# Altium integrated library Mastermind Devices.IntLib: 910 symbols (part 3 of 6) (continued)
## MOSFET-NCE6005AS
designator U?, comment NCE6005AS  (value not drawn)
2 N-Channel 60V 7A 27mΩ@4.5V,4A 2W 2.4V@250uA  SOIC-8 MOSFETs ROHS
footprint SOIC-8E (SOIC, 8-Leads, Body 4.90x3.90mm, Pitch 1.27mm, IPC Medium Density); pin to pad 6>5+6 8>7+8
part A pins: 1 S1, 2 G1, 8 D1
part B pins: 3 S2, 4 G2, 6 D2

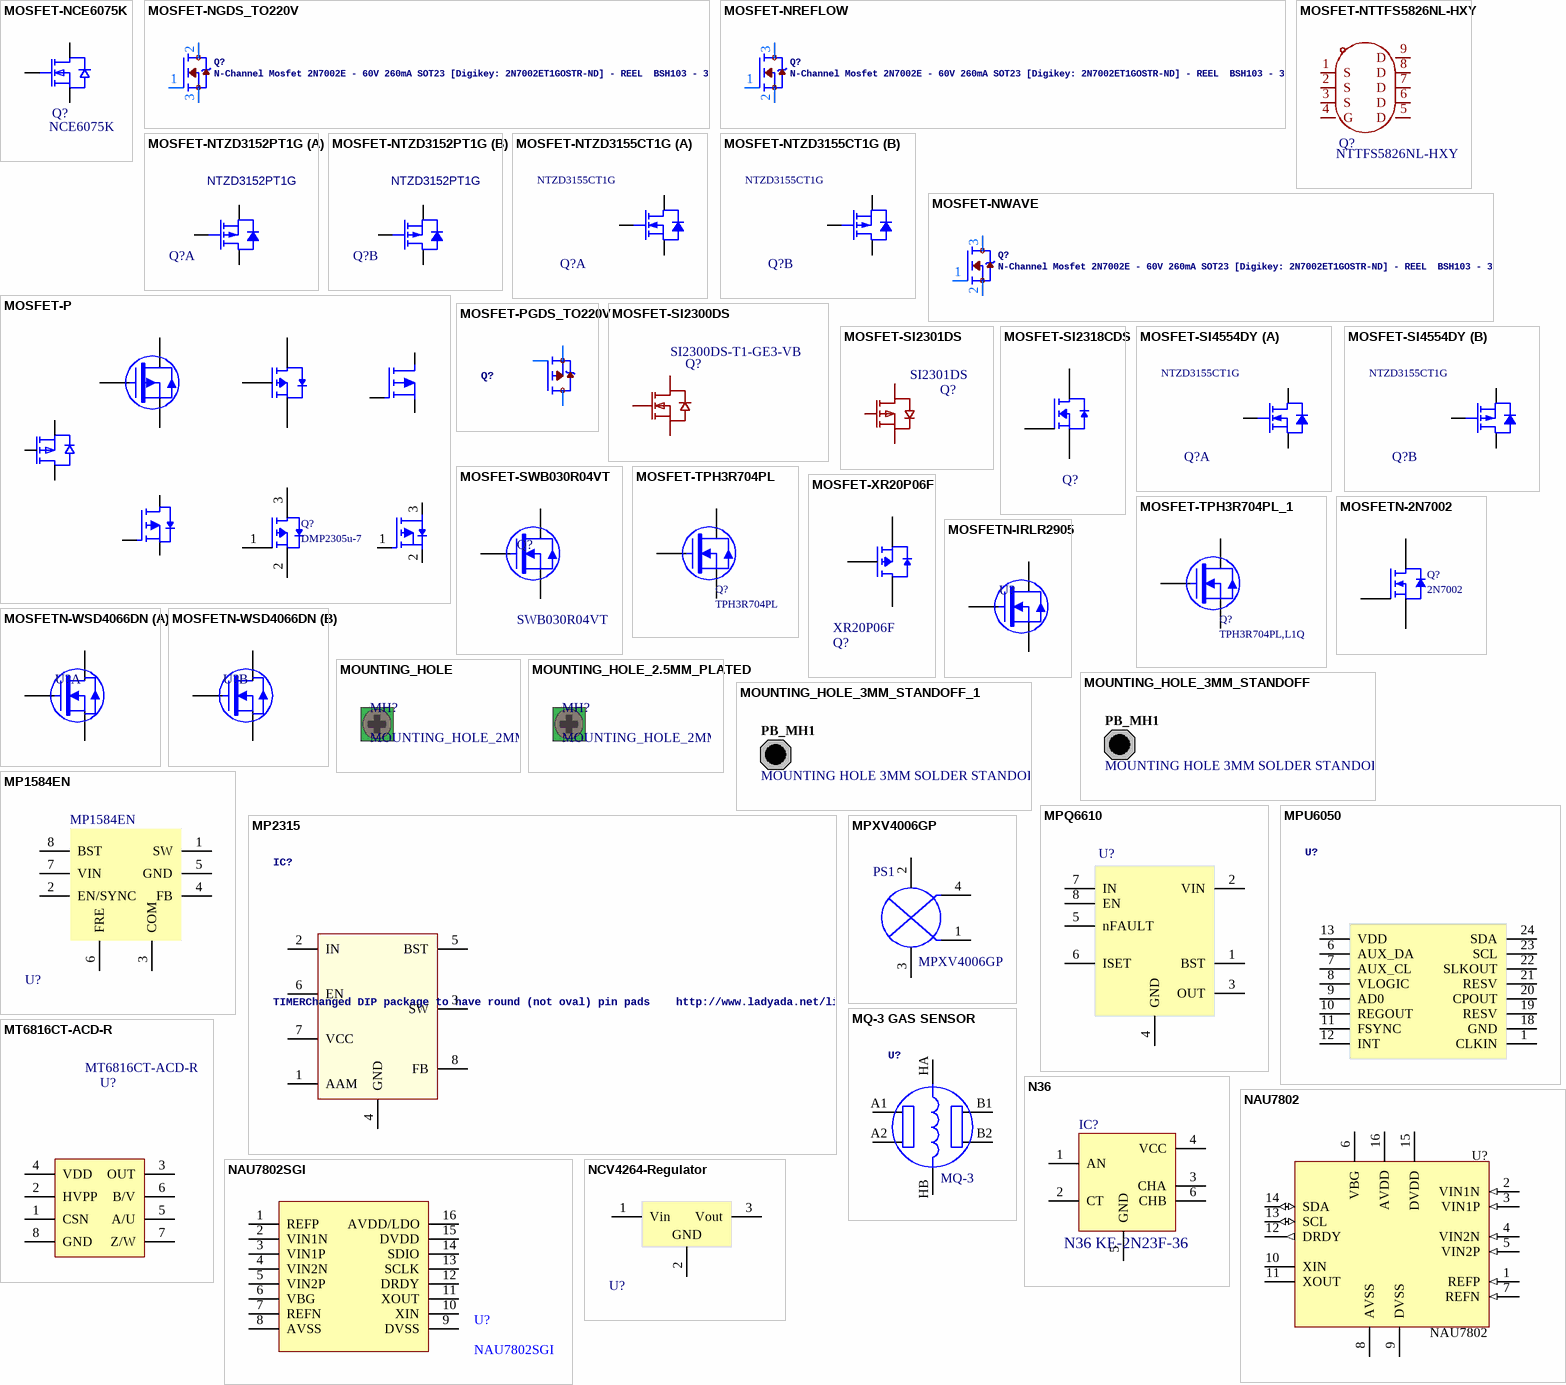
[diagram p20: symbols MOSFET-NCE6075K to NCV4264-Regulator]

## MOSFET-NCE6075K
designator Q?, comment NCE6075K
1 N-Channel 11.5mΩ@10V,30A 110W 4V@250uA 50nC@10V 60V 75A N-Channel TO-252-2L MOSFETs ROHS; Manufacturer: NCE(无锡新洁能); Add into BOM: yes; Symbol: NCE6075K; Device: NCE6075K; LCSC Part Name: 1个N沟道 耐压:60V 电流:75A; Supplier Part: C110912; Manufacturer Part: NCE6075K; Supplier Footprint: TO-252-2L; JLCPCB Part Class: Extended Part; Datasheet: https://item.szlcsc.com/datasheet/NCE6075K/112137.html; Supplier: LCSC; Convert to PCB: yes; Number: 1 N-Channel; Drain to Source Voltage: 60V; Current - Continuous Drain(Id): 75A; RDS(on): 11.5mΩ@10V,30A; Pd - Power Dissipation: 110W; Gate Threshold Voltage (Vgs(th)): 4V@250uA; Gate Charge(Qg): 50nC@10V; Input Capacitance(Ciss): -; Reverse Transfer Capacitance (Crss@Vds): -; Operating Temperature: -55℃~+175℃; Type: N-Channel; Output Capacitance(Coss): -
3D model TO-252-2L-3P_L6.6-W6.1-H2.3-LS10.1-P4.6
footprint TO-252-2_L6.6-W6.1-P4.57-LS9.9-TL-CW
pins: 1 G, 2 D, 3 S

## MOSFET-NGDS_TO220V
designator Q?, comment N-Channel Mosfet 2N7002E - 60V 260mA SOT23 [Digikey: 2N7002ET1GOSTR-ND] - REEL  BSH103 - 30V 850mA SOT23 [Digikey: 568-5013-1-ND]
footprint TO220V
pins: 1 G, 2 D, 3 S

## MOSFET-NREFLOW
designator Q?, comment N-Channel Mosfet 2N7002E - 60V 260mA SOT23 [Digikey: 2N7002ET1GOSTR-ND] - REEL  BSH103 - 30V 850mA SOT23 [Digikey: 568-5013-1-ND]
footprint SOT23
pins: 1 G, 2 S, 3 D

## MOSFET-NTTFS5826NL-HXY
designator Q?, comment NTTFS5826NL-HXY
Manufacturer: HXY MOSFET(华轩阳电子); Add into BOM: yes; Number: 1 N-Channel; Drain to Source Voltage: 60V; Current - Continuous Drain(Id): 30A; RDS(on): 25mΩ@10V,15A; Pd - Power Dissipation: 34.7W; Gate Threshold Voltage (Vgs(th)): 2.5V; Gate Charge(Qg): 12.6nC@4.5V; Input Capacitance(Ciss): 1.378nF@48V; Reverse Transfer Capacitance (Crss@Vds): 64pF@48V; Symbol: NTTFS5826NL; Device: NTTFS5826NL-HXY; LCSC Part Name: 1个N沟道 耐压:60V 电流:30A; Supplier Part: C5148681; Manufacturer Part: NTTFS5826NL-HXY; Supplier Footprint: DFN-8L(3x3); JLCPCB Part Class: Extended Part; Datasheet: https://item.szlcsc.com/datasheet/NTTFS5826NL-HXY/5771918.html; Supplier: LCSC; Convert to PCB: yes; Operating Temperature: -55℃~+150℃
footprint DFN-8_L3.2-W3.1-P0.65-LS3.4-BL
3D model PDFN3333-8_L3.1-W3.2-H0.8-P0.65
pins: 1 S, 2 S, 3 S, 4 G, 5 D, 6 D, 7 D, 8 D, 9 D

## MOSFET-NTZD3152PT1G
designator Q?, comment NTZD3152PT1G
Dual P-Channel MOSFET 20V 1A; Manufacturer: TECH PUBLIC(台舟); Contributor: lcsc; Supplier: LCSC; Supplier Part: C7472928; Manufacturer Part: NTZD3152PT1G; spicePre: U; spiceSymbolName: NTZD3152PT1G_C7472928
footprint SOT-563_L1.6-W1.2-P0.50-LS1.6-BR
part A pins: 1 S, 2 G, 6 D
part B pins: 3 D, 4 S, 5 G

## MOSFET-NTZD3155CT1G
designator Q?, comment NTZD3155CT1G
N- and P-Channel MOSFET 20V; Manufacturer Name: ONSemi; Manufacturer Part No.: NTZD3155CT1G
footprint SOTFL50P160X60-6N
part A pins: 1 S, 2 G, 6 D
part B pins: 3 D, 4 S, 5 G

## MOSFET-NWAVE
designator Q?, comment N-Channel Mosfet 2N7002E - 60V 260mA SOT23 [Digikey: 2N7002ET1GOSTR-ND] - REEL  BSH103 - 30V 850mA SOT23 [Digikey: 568-5013-1-ND]
footprint SOT23-W
pins: 1 G, 2 S, 3 D

## MOSFET-P
designator Q?, comment DMP2305u-7
P Channel Mosfet
pins: 1 "Gate", 1 G, 1 G, 1 G, 1 G, 2 "Source", 2 S, 2 D, 2 D, 2 S, 2 S, 3 "Drain", 3 D, 3 S, 3 D, 3 S "Source", 3 D, 4 S, 4 G, 4 G "Gate", 6 D "Drain"

## MOSFET-PGDS_TO220V
designator Q?
footprint TO220V
pins: 1 G, 2 D, 3 S

## MOSFET-SI2300DS
designator Q?, comment SI2300DS-T1-GE3-VB
30V 3.6A 1.1W 0.068Ω@4.5V,2.9A 1.5V@250uA 1 N-channel SOT-23 MOSFETs ROHS; Manufacturer: VBsemi(微碧半导体); Symbol: SI2300DS-T1-GE3_C558241; Add into BOM: yes; Gate Threshold Voltage (Vgs(th)@Id): 1V@250uA; Total Gate Charge (Qg@Vgs): 8.8nC@4.5V; Input Capacitance (Ciss@Vds): 865pF@10V; Reverse Transfer Capacitance (Crss@Vds): 55pF@10V; Device: SI2300DS-T1-GE3-VB; LCSC Part Name: 1个N沟道 耐压:20V 电流:6A; Supplier Part: C558241; Manufacturer Part: SI2300DS-T1-GE3-VB; Supplier Footprint: SOT-23; JLCPCB Part Class: Extended Part; Datasheet: https://atta.szlcsc.com/upload/public/pdf/source/20240805/BAEE3EC2652A2054BB07DC75B93B20A3.pdf; Supplier: LCSC; Convert to PCB: yes; Type: 1 N-Channel; Drain Source On Resistance (RDS(on)@Vgs,Id): -; Operating Temperature: -55℃~+150℃@(Tj)
footprint SOT-23-3_L2.9-W1.6-P1.90-LS2.8-BR
pins: 1 G, 2 S, 3 D

## MOSFET-SI2301DS
designator Q?, comment SI2301DS
20V 3A 110mΩ@4.5V,3A 1W 1V@250uA SOT-23-3 MOSFETs ROHS; Manufacturer: TECH PUBLIC(台舟); Add into BOM: yes; Total Gate Charge (Qg@Vgs): 12nC@10V; Input Capacitance (Ciss@Vds): 405pF@10V; Reverse Transfer Capacitance (Crss@Vds): 55pF@10V; Symbol: SI2301DS; Device: SI2301DS; LCSC Part Name: 耐压:20V 电流:3A; Supplier Part: C2841444; Manufacturer Part: SI2301DS; Supplier Footprint: SOT-23-3; JLCPCB Part Class: Extended Part; Datasheet: https://atta.szlcsc.com/upload/public/pdf/source/20210623/C2841444_F8915202D3D7667D175CCC150AA2E443.pdf; Supplier: LCSC; Convert to PCB: yes; Drain Source Voltage (Vdss): 20V; Drain Source On Resistance (RDS(on)@Vgs,Id): 110mΩ@4.5V,3A; Gate Threshold Voltage (Vgs(th)@Id): 1V@250uA; Operating Temperature: -55℃~+150℃
footprint SOT-23-3_L2.9-W1.3-P1.90-LS2.4-BR
pins: 1 G, 2 S, 3 D

## MOSFET-SI2318CDS
designator Q?, comment SI2318CDS  (value not drawn)
N-Channel Mosfet- 40V 5.6A
footprint SOT23
pins: 1 G "Gate", 2 S "Drain", 3 D "Source"

## MOSFET-SI4554DY
designator Q?, comment Manufacturer Part No.: NTZD3155CT1G  (hidden comment: Verfiy PinS first)
N&P-Channel MOSFET 40V 8A; Manufacturer Name: ONSemi
footprint SOIC-8E (SOIC, 8-Leads, Body 4.90x3.90mm, Pitch 1.27mm, IPC Medium Density)
part A pins: 1 S, 2 G, 6 D
part B pins: 3 D, 4 S, 5 G

## MOSFET-SWB030R04VT
designator Q?, comment SWB030R04VT
N-Channel MOSFET,  40V 130A  2.8mΩ; Published: 24-Mar-1999; LatestRevisionDate: 29-May-2009; LatestRevisionNote: IPC-7351 Footprint Added.; PackageVersion: Sep-2000; PackageReference: SOT-343; Publisher: Altium Limited; PackageDescription: 4-Pin SOT-343 Package 1.3 mm Pitch, 2.1 mm Lead Span
footprint TO-263-2
pins: 1 G, 2 D, 3 S

## MOSFET-TPH3R704PL
designator Q?, comment TPH3R704PL
N Channel Mosfet 30V 40A dfn-8
footprint DSOP-8_L5.0-W5.0-P1.27-LS6.0-BL-EP
pins: 1 G, 2 S, 3 D

## MOSFET-TPH3R704PL_1
designator Q?, comment TPH3R704PL,L1Q
N Channel Mosfet 40V 92A dfn-8
footprint POWERDI3333-8_L3.3-W3.3-P0.65-BL
pins: 1 G, 2 S, 3 D

## MOSFET-XR20P06F
designator Q?, comment XR20P06F
P Channel 60V 20A 60mΩ@10V 25W 2.5V@250uA PDFN5060-8L Single FETs, MOSFETs ROHS; Manufacturer: XNRUSEMI(新锐); Add into BOM: yes; Gate Charge(Qg): 6.1nC@4.5V; Input Capacitance(Ciss): 585pF; Reverse Transfer Capacitance (Crss@Vds): 85pF; Type: P-Channel; Output Capacitance(Coss): 100pF; Symbol: XR20P06F; Device: XR20P06F; LCSC Part Name: XR20P06F; Supplier Part: C42457007; Manufacturer Part: XR20P06F; Supplier Footprint: PDFN5060-8L; JLCPCB Part Class: Extended Part; Datasheet: https://item.szlcsc.com/datasheet/XR20P06F/44528097.html; Supplier: LCSC; Convert to PCB: yes; Drain to Source Voltage: 60V; Current - Continuous Drain(Id): 20A; RDS(on): 60mΩ@10V; Pd - Power Dissipation: 25W; Gate Threshold Voltage (Vgs(th)): 2.5V@250uA; Operating Temperature: -55℃~+150℃
footprint PDFN-8_L5.8-W5.0-P1.27-LS6.1-BL
3D model PDFN-8_L4.9-W5.8-H1.0-P1.27
pins: 1,2,3 S "Source", 4 G "Gate", 5,6,7,8,9 D "Drain"

## MOSFETN-2N7002
designator Q?, comment 2N7002
N Channel Mosfet
footprint SOT23
pins: 1 "Gate", 2 "Source", 3 "Drain"

## MOSFETN-IRLR2905
designator U?, comment IRLR2905  (value not drawn)
55V 42A  27mΩ  TO-252
footprint TO252
pins: 1 G, 2 S, 3 D

## MOSFETN-WSD4066DN
designator U?, comment WSD4066DN  (value not drawn)
Dual Mosfet in one package
footprint DFN-8_L3.2-W3.1-P0.65-LS3.4-BL-EP; pin to pad 6>5+6 8>7+8
part A pins: 1 S1, 2 G1, 8 D1
part B pins: 3 S2, 4 G2, 6 D2

## MOUNTING_HOLE
designator MH?, comment MOUNTING_HOLE_2MM
footprint MOUNTING_HOLE_2MM
footprint MOUNTING_HOLE_3.5mm
footprint MOUNTINGHOLE_2.5_PLATED
footprint MOUNT_HOLE_2.5-D6.2_NonPlated
pins: MOUNT 3

## MOUNTING_HOLE_2.5MM_PLATED
designator MH?, comment MOUNTING_HOLE_2MM
footprint MOUNTINGHOLE_2.5_PLATED
pins: MOUNT 3

## MOUNTING_HOLE_3MM_STANDOFF
designator PB_MH1, comment MOUNTING HOLE 3MM SOLDER STANDOFF  (no BOM)
Mounting Hole for Solder Standoff, M3 Screw, Plated, Round Pad; Category: Mounting-Hole; Status: Production
footprint STANDOFF_SOLDER_3MM
pins: 1 hidden

## MOUNTING_HOLE_3MM_STANDOFF_1
designator PB_MH1, comment MOUNTING HOLE 3MM SOLDER STANDOFF  (no BOM)
Mounting Hole for Solder Standoff, M3 Screw, Plated, Round Pad; Category: Mounting-Hole; Status: Production
footprint STANDOFF_SOLDER_3MM
pins: 1 hidden

## MP1584EN
designator U?  Name: MP1584EN
footprint SOIC-8E _GND (SOIC, 8-Leads, Body 4.90x3.90mm, Pitch 1.27mm, IPC Medium Density); pin to pad 5>5+9
pins: 1 SW (power), 2 EN/SYNC, 3 COM, 4 FB (power), 5 GND, 6 FRE, 7 VIN, 8 BST

## MP2315
designator IC?, comment TIMERChanged DIP package to have round (not oval) pin pads    http://www.ladyada.net/library/pcb/eaglelibrary.html
footprint SOT23-8
pins: 1 AAM (power), 2 IN, 3 SW, 4 GND (power), 5 BST, 6 EN, 7 VCC, 8 FB

## MPQ6610
designator U?, comment MPQ6610  DC Motor Drivers  (value not drawn)
SOIC-8 Brushed DC Motor Drivers ROHS
footprint SOIC-8_L4.9-W3.9-P1.27-LS6.0-BL
footprint SOIC-8E (SOIC, 8-Leads, Body 4.90x3.90mm, Pitch 1.27mm, IPC Medium Density)
pins: 1 BST (power), 2 VIN, 3 OUT, 4 GND, 5 nFAULT, 6 ISET, 7 IN, 8 EN (power)

## MPU6050
designator U?
footprint MPU6050
pins: 1 CLKIN (power), 6 AUX_DA (power), 7 AUX_CL, 8 VLOGIC, 9 AD0, 10 REGOUT, 11 FSYNC, 12 INT, 13 VDD, 18 GND, 19 RESV, 20 CPOUT, 21 RESV, 22 SLKOUT, 23 SCL, 24 SDA

## MPXV4006GP
designator PS1
Pressure Sensor 0.87PSI _6kPa_ Vented Gauge Male - 0.13 _3.17mm_ Tube 0.2 V ~ 4.7 V 8-SMD, Gull Wing, Side Port; DETAILS: Board Mount Pressure Sensors SOP TOP PORT; MFG: NXP Semiconductors; MFGPN: MPXV4006GP; PACKAGE: TOP PORT; URL: https://www.mouser.co.uk/ProductDetail/NXP-Semiconductors/MPXV4006GP?qs=r8OyiFxb6RebIOUWIUZL2A%3D%3D
footprint SOP8-1369
pins: 1 OUT, 2 Vcc (power), 3 GND (power), 4 OUT

## MQ-3 GAS SENSOR
designator U?  (value not drawn)
footprint MQ-3
pins: A1, A2, B1, B2, HA H1, HB H1 (power)
text: MQ-3

## MT6816CT-ACD-R
designator U?
Manufacturer: MagnTek(麦歌恩); Add into BOM: yes; Symbol: MT6816CT-ACD-R; Device: MT6816CT-ACD-R; LCSC Part Name: 零延迟磁角位置传感器IC; Supplier Part: C2991082; Manufacturer Part: MT6816CT-ACD-R; Supplier Footprint: SOP-8; JLCPCB Part Class: Extended Part; Datasheet: https://atta.szlcsc.com/upload/public/pdf/source/20220425/8C4FA5078DAA03A6453D0085CD0FDDFE.pdf; Supplier: LCSC; Convert to PCB: yes
footprint SOP-8_L4.9-W3.9-P1.27-LS6.0-BL (Footprint not found)
pins: 1 CSN, 2 HVPP, 3 OUT, 4 VDD, 5 A/U, 6 B/V, 7 Z/W, 8 GND

## N36
designator IC?, comment N36 KE-2N23F-36
Opto Encoder
footprint KE2N236
pins: 1 AN, 2 CT, 3 CHA, 4 VCC, 5 GND, 6 CHB

## NAU7802
designator U?
GateName_1: G$1; SymbolName_1: NAU7802; LibraryName: adafruit_sensor; DeviceSetName: NAU7802; NAU7802: NAU7802
footprint SOP-16_L9.9-W3.9-P1.27-LS6.0-BL
pins: 1 REFP (in), 2 VIN1N (in), 3 VIN1P (in), 4 VIN2N (in), 5 VIN2P (in), 6 VBG (power), 7 REFN (in), 8 AVSS (power), 9 DVSS (power), 10 XIN, 11 XOUT, 12 DRDY (out), 13 SCL (io), 14 SDA (io), 15 DVDD (power), 16 AVDD (power)

## NAU7802SGI
designator U?
Manufacturer: NUVOTON(新唐); Add into BOM: yes; Interface: I2C; number of channels: 2; Supply Voltage: 2.7V~5.5V; sampling frequency: 80Hz; resolution: 24Bit; Symbol: NAU7802SGI; Device: NAU7802SGI; Supplier: LCSC; Supplier Part: C2614351; Manufacturer Part: NAU7802SGI; JLCPCB Part Class: Extended Part; LCSC Part Name: NAU7802SGI; Supplier Footprint: SOP-16; Datasheet: https://atta.szlcsc.com/upload/public/pdf/source/20210417/C2614351_F0E6A78D6A0A2C65262CB499A8BCF368.pdf; Convert to PCB: yes; differential input: Yes; Operating Temperature: -40℃~+85℃
footprint SOP-16_L9.9-W3.9-P1.27-LS6.0-BL
pins: 1 REFP, 2 VIN1N, 3 VIN1P, 4 VIN2N, 5 VIN2P, 6 VBG, 7 REFN, 8 AVSS, 9 DVSS, 10 XIN, 11 XOUT, 12 DRDY, 13 SCLK, 14 SDIO, 15 DVDD, 16 AVDD/LDO

## NCV4264-Regulator
designator U?
footprint SOT223
pins: 1 Vin, 2 GND, 3 Vout

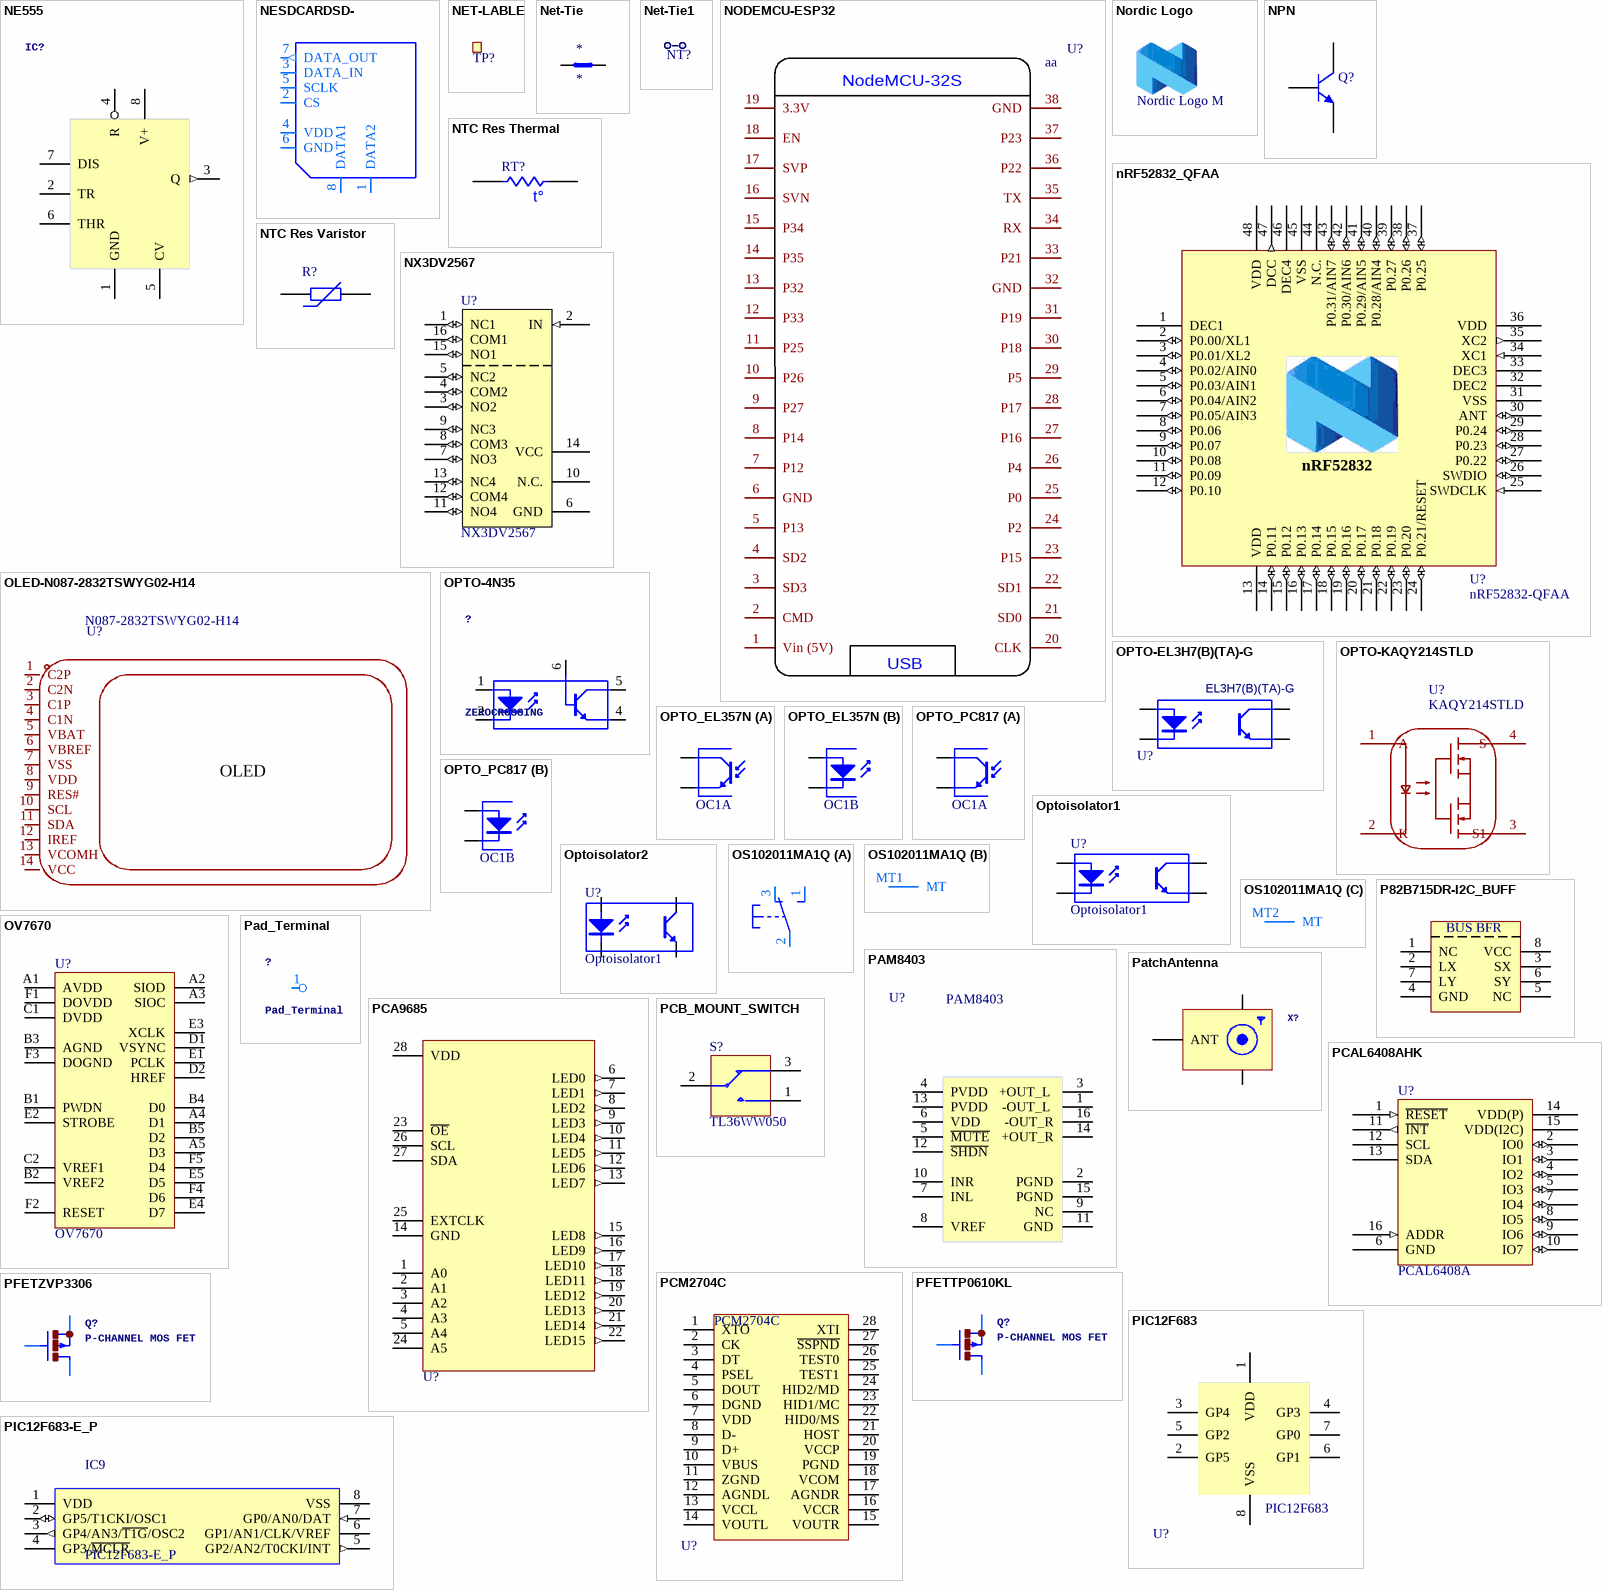
[diagram p21: symbols NE555 to PIC12F683-E_P]

## NE555
designator IC?, comment TIMERChanged DIP package to have round (not oval) pin pads    http://www.ladyada.net/library/pcb/eaglelibrary.html  (value not drawn)
footprint DIL08-ROUND
pins: 1 GND (power), 2 TR, 3 Q (out), 4 R, 5 CV, 6 THR, 7 DIS, 8 V+ (power)

## NESDCARDSD-
designator ?
footprint SD-CARD
pins: 1 DATA2, 2 CS, 3 DATA_IN, 4 VDD (oe), 5 SCLK, 6 GND (oe), 7 DATA_OUT (out), 8 DATA1

## NET-LABLE
designator TP?, comment TP  (value not drawn)  (no BOM)
Testpoint, through hole; Part Number: Testpoint TH; Artikkelnr Noca: N.A.; Manufacturer: *; Manufacturer Part Number: *; Datasheet: *; Footprint Doc: TESTPAD-TH; LatestRevisionDate: 2009-12-12; Pin Count: 1; Publisher: Nordic Semiconductor; Published: 2009-12-12; Value: TP; Note: *; Supplier: *; Supplier part number: *; 2nd source Supplier: *; 2nd source part number: *; Artikkelnr Simpro: N.A.
pins: 1

## Net-Tie
designator *
footprint NETTIE_DIP
footprint NETTIE_0.5
footprint NETTIE_Track 0.2mm
pins: 1, 2

## Net-Tie1
designator NT?  (value not drawn)  (no BOM)
Jumper, 2-Pin
signal-integrity model Connector
footprint NETTIE_Track 0.2mm
footprint NETTIE_0.5
footprint NETTIE_DIP
pins: 1, 2

## NODEMCU-ESP32
designator U?, comment aa
footprint AI-THINKER_NODEMCU-32SLUA
pins: 1 Vin (5V), 2 CMD, 3 SD3, 4 SD2, 5 P13, 6 GND, 7 P12, 8 P14, 9 P27, 10 P26, 11 P25, 12 P33, 13 P32, 14 P35, 15 P34, 16 SVN, 17 SVP, 18 EN, 19 3.3V, 20 CLK, 21 SD0, 22 SD1, 23 P15, 24 P2, 25 P0, 26 P4, 27 P16, 28 P17, 29 P5, 30 P18, 31 P19, 32 GND, 33 P21, 34 RX, 35 TX, 36 P22, 37 P23, 38 GND
text: NodeMCU-32S; USB

## Nordic Logo
designator LOGO?, comment Nordic Logo M  (no BOM)
Nordic Logo, medium size; Artikkelnr Noca: N.A.; Part Number: Nordic Logo M; Manufacturer: *; Manufacturer Part Number: *; Datasheet: *; LatestRevisionDate: 2010-02-18; Publisher: Nordic Semiconductor; Value: Nordic Logo M; Note: *; Supplier: *; Supplier part number: *; 2nd source Supplier: *; 2nd source part number: *; Pin Count: 2; Published: 2010-02-18; Footprint Doc: NORDIC_LOGO_M; Artikkelnr Simpro: N.A.
footprint NORDIC_LOGO_M

## NPN
designator Q?
NPN Bipolar Transistor; Published: 8-Jun-2000; LatestRevisionDate: 17-Jul-2002; LatestRevisionNote: Re-released for DXP Platform.; PackageReference: TO-226-AA; Publisher: Altium Limited; PackageDescription: TO, Flat Index; 3 In-Line, Axial Leads; Body Dia. 4.8mm; Leads 0.55 x 0.51 mm (max); Code_JEDEC: TO-226-AA
simulation model NPN
signal-integrity model NPN
footprint SOT23
pins: 1 B, 2 E, 3 C

## nRF52832_QFAA
designator U?, comment nRF52832-QFAA
Multi-protocol Bluetooth Low Energy and 2.4GHz proprietary system-on-chip; Manufacturer: Nordic Semiconductor; Artikkelnr Noca: N.A.; Part Number: nRF52832-QFAA; Manufacturer Part Number: nRF52832-QFAA; Datasheet: *; LatestRevisionDate: 2014-11-26; Pin Count: 48; Publisher: Nordic Semiconductor; Published: 2014-11-26; Value: nRF52832-QFAA; Note: *; Supplier: Nordic Semiconductor; Supplier part number: *; 2nd source Supplier: *; 2nd source part number: *; Footprint Doc: QFN-48; Artikkelnr Simpro: N.A.
footprint QFN40P600X600X90-48N
pins: 1 DEC1 (power), 2 P0.00/XL1 (io), 3 P0.01/XL2 (io), 4 P0.02/AIN0 (io), 5 P0.03/AIN1 (io), 6 P0.04/AIN2 (io), 7 P0.05/AIN3 (io), 8 P0.06 (io), 9 P0.07 (io), 10 P0.08 (io), 11 P0.09 (io), 12 P0.10 (io), 13 VDD (power), 14 P0.11 (io), 15 P0.12 (io), 16 P0.13 (io), 17 P0.14 (io), 18 P0.15 (io), 19 P0.16 (io), 20 P0.17 (io), 21 P0.18 (io), 22 P0.19 (io), 23 P0.20 (io), 24 P0.21/RESET (io), 25 SWDCLK (in), 26 SWDIO (io), 27 P0.22 (io), 28 P0.23 (io), 29 P0.24 (io), 30 ANT (io), 31 VSS (power), 32 DEC2 (power), 33 DEC3 (power), 34 XC1 (in), 35 XC2 (out), 36 VDD (power), 37 P0.25 (io), 38 P0.26 (io), 39 P0.27 (io), 40 P0.28/AIN4 (io), 41 P0.29/AIN5 (io), 42 P0.30/AIN6 (io), 43 P0.31/AIN7 (io), 44 N.C. (power), 45 VSS (power), 46 DEC4 (power), 47 DCC (out), 48 VDD (power), 49 GND (power) hidden to GND
text: nRF52832

## NTC Res Thermal
designator RT?
Thermistor; Published: 24-Mar-1999; LatestRevisionDate: 29-May-2009; LatestRevisionNote: IPC-7351 Footprint Added.; PackageVersion: Mar-2003; PackageReference: 6-0805; Publisher: Altium Limited; PackageDescription: Chip Resistor 0805 Case Size; Code_IPC: RESC2012
pins: 1, 2
text: t°

## NTC Res Varistor
designator R?
Varistor (Voltage-Sensitive Resistor); Published: 24-Mar-1999; LatestRevisionDate: 29-May-2009; LatestRevisionNote: IPC-7351 Footprint Added.; PackageVersion: Mar-2003; PackageReference: 6-0805; Publisher: Altium Limited; PackageDescription: Chip Resistor 0805 Case Size; Code_IPC: RESC2012
footprint C0402-NO
pins: 1, 2